# Altium footprint library con-samtec.PCBLIB: 805 footprints (part 29 of 55)
Each footprint in its own frame and in the unit in brackets; x right, y up, seen from the top. Pads: shape width x height; smd on the part's side, far side on the other; paste and mask are expansions set on the pad; w line width, h text height; cw(c..) or ccw(c..) is an arc to the next point about the centre after c.
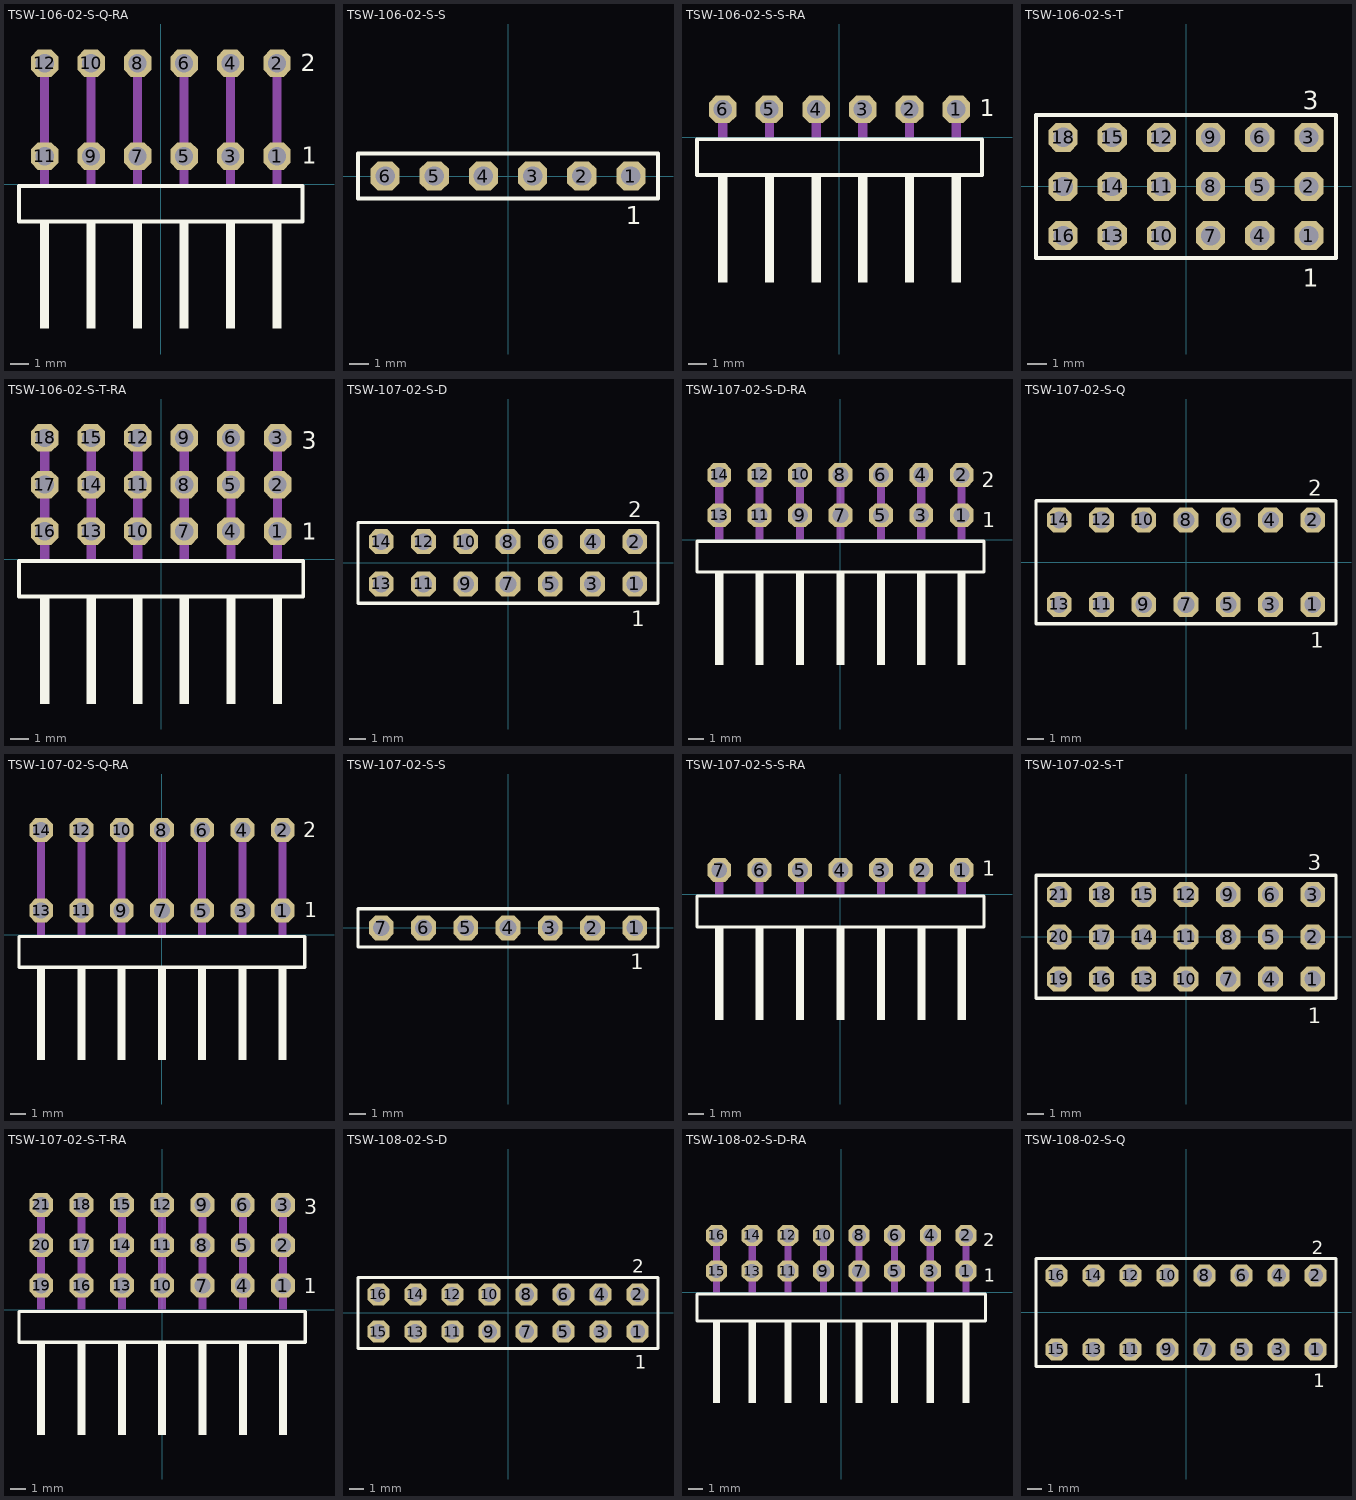
[diagram p28: the footprints below, top view; thin cyan lines are the x and y axes]

## TSW-106-02-S-Q-RA [mil]
pads (12):
  oct 59.06x59.06 hole 39.37: 1(250,60) 2(250,260) 3(150,60) 4(150,260) 5(50,60) 6(50,260) 7(-50,60) 8(-50,260) 9(-150,60) 10(-150,260) 11(-250,60) 12(-250,260)
Top Overlay:
  rectangle: -260,-310.63 -240,-80.32
  rectangle: -160,-310.63 -140,-80.32
  rectangle: -60,-310.63 -40,-80.32
  rectangle: 40,-310.63 60,-80.32
  rectangle: 140,-310.63 160,-80.32
  rectangle: 240,-310.63 260,-80.32
  lines w8: -305.08,-80.55 305.08,-80.55 305.08,-4.17 -305.08,-4.17 -305.08,-80.55
  text "1" at 303.54,43.31 h36.81
  text "2" at 301.18,242.72 h36.81
Mechanical 16:
  rectangle: -260,0 -240,270
  rectangle: -160,0 -140,270
  rectangle: -60,0 -40,270
  rectangle: 40,0 60,270
  rectangle: 140,0 160,270
  rectangle: 240,0 260,270

## TSW-106-02-S-S [mm]
pads (6):
  oct 1.5x1.5 hole 1: 1(6.35,0) 2(3.81,0) 3(1.27,0) 4(-1.27,0) 5(-3.81,0) 6(-6.35,0)
Top Overlay:
  lines w0.203: -7.749,-1.155 7.749,-1.155 7.749,1.155 -7.749,1.155 -7.749,-1.155
  text "1" at 6.092,-2.498 h0.94
Mechanical 16:
  rectangle: -6.7,-0.35 -6,0.35
  rectangle: -4.16,-0.35 -3.46,0.35
  rectangle: -1.62,-0.35 -0.92,0.35
  rectangle: 0.92,-0.35 1.62,0.35
  rectangle: 3.46,-0.35 4.16,0.35
  rectangle: 6,-0.35 6.7,0.35

## TSW-106-02-S-S-RA [mil]
pads (6):
  oct 59.06x59.06 hole 39.37: 1(250,60) 2(150,60) 3(50,60) 4(-50,60) 5(-150,60) 6(-250,60)
Top Overlay:
  rectangle: -260,-310.63 -240,-80.32
  rectangle: -160,-310.63 -140,-80.32
  rectangle: -60,-310.63 -40,-80.32
  rectangle: 40,-310.63 60,-80.32
  rectangle: 140,-310.63 160,-80.32
  rectangle: 240,-310.63 260,-80.32
  lines w8: -305.08,-80.55 305.08,-80.55 305.08,-4.17 -305.08,-4.17 -305.08,-80.55
  text "1" at 300.47,45.35 h36.81
Mechanical 16:
  rectangle: -260,0 -240,70
  rectangle: -160,0 -140,70
  rectangle: -60,0 -40,70
  rectangle: 40,0 60,70
  rectangle: 140,0 160,70
  rectangle: 240,0 260,70

## TSW-106-02-S-T [mm]
pads (18):
  oct 1.5x1.5 hole 1: 1(6.35,-2.54) 2(6.35,0) 3(6.35,2.54) 4(3.81,-2.54) 5(3.81,0) 6(3.81,2.54) 7(1.27,-2.54) 8(1.27,0) 9(1.27,2.54) 10(-1.27,-2.54) 11(-1.27,0) 12(-1.27,2.54) 13(-3.81,-2.54) 14(-3.81,0) 15(-3.81,2.54) 16(-6.35,-2.54) 17(-6.35,0) 18(-6.35,2.54)
Top Overlay:
  lines w0.203: -7.749,-3.695 7.749,-3.695 7.749,3.695 -7.749,3.695 -7.749,-3.695
  text "1" at 6.042,-5.188 h0.94
  text "3" at 6.038,3.989 h0.94
Mechanical 16:
  rectangle: -6.7,-2.89 -6,-2.19
  rectangle: -6.7,-0.35 -6,0.35
  rectangle: -6.7,2.19 -6,2.89
  rectangle: -4.16,-2.89 -3.46,-2.19
  rectangle: -4.16,-0.35 -3.46,0.35
  rectangle: -4.16,2.19 -3.46,2.89
  rectangle: -1.62,-2.89 -0.92,-2.19
  rectangle: -1.62,-0.35 -0.92,0.35
  rectangle: -1.62,2.19 -0.92,2.89
  rectangle: 0.92,-2.89 1.62,-2.19
  rectangle: 0.92,-0.35 1.62,0.35
  rectangle: 0.92,2.19 1.62,2.89
  rectangle: 3.46,-2.89 4.16,-2.19
  rectangle: 3.46,-0.35 4.16,0.35
  rectangle: 3.46,2.19 4.16,2.89
  rectangle: 6,-2.89 6.7,-2.19
  rectangle: 6,-0.35 6.7,0.35
  rectangle: 6,2.19 6.7,2.89

## TSW-106-02-S-T-RA [mil]
pads (18):
  oct 59.06x59.06 hole 39.37: 1(250,60) 2(250,160) 3(250,260) 4(150,60) 5(150,160) 6(150,260) 7(50,60) 8(50,160) 9(50,260) 10(-50,60) 11(-50,160) 12(-50,260) 13(-150,60) 14(-150,160) 15(-150,260) 16(-250,60) 17(-250,160) 18(-250,260)
Top Overlay:
  rectangle: -260,-310.63 -240,-80.32
  rectangle: -160,-310.63 -140,-80.32
  rectangle: -60,-310.63 -40,-80.32
  rectangle: 40,-310.63 60,-80.32
  rectangle: 140,-310.63 160,-80.32
  rectangle: 240,-310.63 260,-80.32
  lines w8: -305.08,-80.55 305.08,-80.55 305.08,-4.17 -305.08,-4.17 -305.08,-80.55
  text "1" at 301.57,41.34 h36.81
  text "3" at 302.17,236.81 h36.81
Mechanical 16:
  rectangle: -260,0 -240,270
  rectangle: -160,0 -140,270
  rectangle: -60,0 -40,270
  rectangle: 40,0 60,270
  rectangle: 140,0 160,270
  rectangle: 240,0 260,270

## TSW-107-02-S-D [mm]
pads (14):
  oct 1.5x1.5 hole 1: 1(7.62,-1.27) 2(7.62,1.27) 3(5.08,-1.27) 4(5.08,1.27) 5(2.54,-1.27) 6(2.54,1.27) 7(0,-1.27) 8(0,1.27) 9(-2.54,-1.27) 10(-2.54,1.27) 11(-5.08,-1.27) 12(-5.08,1.27) 13(-7.62,-1.27) 14(-7.62,1.27)
Top Overlay:
  lines w0.203: -9.019,-2.425 9.019,-2.425 9.019,2.425 -9.019,2.425 -9.019,-2.425
  text "1" at 7.412,-3.818 h0.94
  text "2" at 7.237,2.744 h0.94
Mechanical 16:
  rectangle: -7.97,-1.62 -7.27,-0.92
  rectangle: -7.97,0.92 -7.27,1.62
  rectangle: -5.43,-1.62 -4.73,-0.92
  rectangle: -5.43,0.92 -4.73,1.62
  rectangle: -2.89,-1.62 -2.19,-0.92
  rectangle: -2.89,0.92 -2.19,1.62
  rectangle: -0.35,-1.62 0.35,-0.92
  rectangle: -0.35,0.92 0.35,1.62
  rectangle: 2.19,-1.62 2.89,-0.92
  rectangle: 2.19,0.92 2.89,1.62
  rectangle: 4.73,-1.62 5.43,-0.92
  rectangle: 4.73,0.92 5.43,1.62
  rectangle: 7.27,-1.62 7.97,-0.92
  rectangle: 7.27,0.92 7.97,1.62

## TSW-107-02-S-D-RA [mil]
pads (14):
  oct 59.06x59.06 hole 39.37: 1(300,60) 2(300,160) 3(200,60) 4(200,160) 5(100,60) 6(100,160) 7(0,60) 8(0,160) 9(-100,60) 10(-100,160) 11(-200,60) 12(-200,160) 13(-300,60) 14(-300,160)
Top Overlay:
  rectangle: -310,-310.63 -290,-80.32
  rectangle: -210,-310.63 -190,-80.32
  rectangle: -110,-310.63 -90,-80.32
  rectangle: -10,-310.63 10,-80.32
  rectangle: 90,-310.63 110,-80.32
  rectangle: 190,-310.63 210,-80.32
  rectangle: 290,-310.63 310,-80.32
  lines w8: -355.08,-80.55 355.08,-80.55 355.08,-4.17 -355.08,-4.17 -355.08,-80.55
  text "1" at 350.59,30.51 h36.81
  text "2" at 349.21,129.53 h36.81
Mechanical 16:
  rectangle: -310,0 -290,170
  rectangle: -210,0 -190,170
  rectangle: -110,0 -90,170
  rectangle: -10,0 10,170
  rectangle: 90,0 110,170
  rectangle: 190,0 210,170
  rectangle: 290,0 310,170

## TSW-107-02-S-Q [mm]
pads (14):
  oct 1.5x1.5 hole 1: 1(7.62,-2.54) 2(7.62,2.54) 3(5.08,-2.54) 4(5.08,2.54) 5(2.54,-2.54) 6(2.54,2.54) 7(0,-2.54) 8(0,2.54) 9(-2.54,-2.54) 10(-2.54,2.54) 11(-5.08,-2.54) 12(-5.08,2.54) 13(-7.62,-2.54) 14(-7.62,2.54)
Top Overlay:
  lines w0.203: -9.019,-3.695 9.019,-3.695 9.019,3.695 -9.019,3.695 -9.019,-3.695
  text "1" at 7.462,-5.138 h0.94
  text "2" at 7.362,3.989 h0.94
Mechanical 16:
  rectangle: -7.97,-2.89 -7.27,-2.19
  rectangle: -7.97,2.19 -7.27,2.89
  rectangle: -5.43,-2.89 -4.73,-2.19
  rectangle: -5.43,2.19 -4.73,2.89
  rectangle: -2.89,-2.89 -2.19,-2.19
  rectangle: -2.89,2.19 -2.19,2.89
  rectangle: -0.35,-2.89 0.35,-2.19
  rectangle: -0.35,2.19 0.35,2.89
  rectangle: 2.19,-2.89 2.89,-2.19
  rectangle: 2.19,2.19 2.89,2.89
  rectangle: 4.73,-2.89 5.43,-2.19
  rectangle: 4.73,2.19 5.43,2.89
  rectangle: 7.27,-2.89 7.97,-2.19
  rectangle: 7.27,2.19 7.97,2.89

## TSW-107-02-S-Q-RA [mil]
pads (14):
  oct 59.06x59.06 hole 39.37: 1(300,60) 2(300,260) 3(200,60) 4(200,260) 5(100,60) 6(100,260) 7(0,60) 8(0,260) 9(-100,60) 10(-100,260) 11(-200,60) 12(-200,260) 13(-300,60) 14(-300,260)
Top Overlay:
  rectangle: -310,-310.63 -290,-80.32
  rectangle: -210,-310.63 -190,-80.32
  rectangle: -110,-310.63 -90,-80.32
  rectangle: -10,-310.63 10,-80.32
  rectangle: 90,-310.63 110,-80.32
  rectangle: 190,-310.63 210,-80.32
  rectangle: 290,-310.63 310,-80.32
  lines w8: -355.08,-80.55 355.08,-80.55 355.08,-4.17 -355.08,-4.17 -355.08,-80.55
  text "1" at 353.54,43.31 h36.81
  text "2" at 351.18,242.72 h36.81
Mechanical 16:
  rectangle: -310,0 -290,270
  rectangle: -210,0 -190,270
  rectangle: -110,0 -90,270
  rectangle: -10,0 10,270
  rectangle: 90,0 110,270
  rectangle: 190,0 210,270
  rectangle: 290,0 310,270

## TSW-107-02-S-S [mm]
pads (7):
  oct 1.5x1.5 hole 1: 1(7.62,0) 2(5.08,0) 3(2.54,0) 4(0,0) 5(-2.54,0) 6(-5.08,0) 7(-7.62,0)
Top Overlay:
  lines w0.203: -9.019,-1.155 9.019,-1.155 9.019,1.155 -9.019,1.155 -9.019,-1.155
  text "1" at 7.362,-2.498 h0.94
Mechanical 16:
  rectangle: -7.97,-0.35 -7.27,0.35
  rectangle: -5.43,-0.35 -4.73,0.35
  rectangle: -2.89,-0.35 -2.19,0.35
  rectangle: -0.35,-0.35 0.35,0.35
  rectangle: 2.19,-0.35 2.89,0.35
  rectangle: 4.73,-0.35 5.43,0.35
  rectangle: 7.27,-0.35 7.97,0.35

## TSW-107-02-S-S-RA [mil]
pads (7):
  oct 59.06x59.06 hole 39.37: 1(300,60) 2(200,60) 3(100,60) 4(0,60) 5(-100,60) 6(-200,60) 7(-300,60)
Top Overlay:
  rectangle: -310,-310.63 -290,-80.32
  rectangle: -210,-310.63 -190,-80.32
  rectangle: -110,-310.63 -90,-80.32
  rectangle: -10,-310.63 10,-80.32
  rectangle: 90,-310.63 110,-80.32
  rectangle: 190,-310.63 210,-80.32
  rectangle: 290,-310.63 310,-80.32
  lines w8: -355.08,-80.55 355.08,-80.55 355.08,-4.17 -355.08,-4.17 -355.08,-80.55
  text "1" at 350.47,45.35 h36.81
Mechanical 16:
  rectangle: -310,0 -290,70
  rectangle: -210,0 -190,70
  rectangle: -110,0 -90,70
  rectangle: -10,0 10,70
  rectangle: 90,0 110,70
  rectangle: 190,0 210,70
  rectangle: 290,0 310,70

## TSW-107-02-S-T [mm]
pads (21):
  oct 1.5x1.5 hole 1: 1(7.62,-2.54) 2(7.62,0) 3(7.62,2.54) 4(5.08,-2.54) 5(5.08,0) 6(5.08,2.54) 7(2.54,-2.54) 8(2.54,0) 9(2.54,2.54) 10(0,-2.54) 11(0,0) 12(0,2.54) 13(-2.54,-2.54) 14(-2.54,0) 15(-2.54,2.54) 16(-5.08,-2.54) 17(-5.08,0) 18(-5.08,2.54) 19(-7.62,-2.54) 20(-7.62,0) 21(-7.62,2.54)
Top Overlay:
  lines w0.203: -9.019,-3.695 9.019,-3.695 9.019,3.695 -9.019,3.695 -9.019,-3.695
  text "1" at 7.312,-5.188 h0.94
  text "3" at 7.308,3.989 h0.94
Mechanical 16:
  rectangle: -7.97,-2.89 -7.27,-2.19
  rectangle: -7.97,-0.35 -7.27,0.35
  rectangle: -7.97,2.19 -7.27,2.89
  rectangle: -5.43,-2.89 -4.73,-2.19
  rectangle: -5.43,-0.35 -4.73,0.35
  rectangle: -5.43,2.19 -4.73,2.89
  rectangle: -2.89,-2.89 -2.19,-2.19
  rectangle: -2.89,-0.35 -2.19,0.35
  rectangle: -2.89,2.19 -2.19,2.89
  rectangle: -0.35,-2.89 0.35,-2.19
  rectangle: -0.35,-0.35 0.35,0.35
  rectangle: -0.35,2.19 0.35,2.89
  rectangle: 2.19,-2.89 2.89,-2.19
  rectangle: 2.19,-0.35 2.89,0.35
  rectangle: 2.19,2.19 2.89,2.89
  rectangle: 4.73,-2.89 5.43,-2.19
  rectangle: 4.73,-0.35 5.43,0.35
  rectangle: 4.73,2.19 5.43,2.89
  rectangle: 7.27,-2.89 7.97,-2.19
  rectangle: 7.27,-0.35 7.97,0.35
  rectangle: 7.27,2.19 7.97,2.89

## TSW-107-02-S-T-RA [mil]
pads (21):
  oct 59.06x59.06 hole 39.37: 1(300,60) 2(300,160) 3(300,260) 4(200,60) 5(200,160) 6(200,260) 7(100,60) 8(100,160) 9(100,260) 10(0,60) 11(0,160) 12(0,260) 13(-100,60) 14(-100,160) 15(-100,260) 16(-200,60) 17(-200,160) 18(-200,260) 19(-300,60) 20(-300,160) 21(-300,260)
Top Overlay:
  rectangle: -310,-310.63 -290,-80.32
  rectangle: -210,-310.63 -190,-80.32
  rectangle: -110,-310.63 -90,-80.32
  rectangle: -10,-310.63 10,-80.32
  rectangle: 90,-310.63 110,-80.32
  rectangle: 190,-310.63 210,-80.32
  rectangle: 290,-310.63 310,-80.32
  lines w8: -355.08,-80.55 355.08,-80.55 355.08,-4.17 -355.08,-4.17 -355.08,-80.55
  text "1" at 351.57,41.34 h36.81
  text "3" at 352.17,236.81 h36.81
Mechanical 16:
  rectangle: -310,0 -290,270
  rectangle: -210,0 -190,270
  rectangle: -110,0 -90,270
  rectangle: -10,0 10,270
  rectangle: 90,0 110,270
  rectangle: 190,0 210,270
  rectangle: 290,0 310,270

## TSW-108-02-S-D [mm]
pads (16):
  oct 1.5x1.5 hole 1: 1(8.89,-1.27) 2(8.89,1.27) 3(6.35,-1.27) 4(6.35,1.27) 5(3.81,-1.27) 6(3.81,1.27) 7(1.27,-1.27) 8(1.27,1.27) 9(-1.27,-1.27) 10(-1.27,1.27) 11(-3.81,-1.27) 12(-3.81,1.27) 13(-6.35,-1.27) 14(-6.35,1.27) 15(-8.89,-1.27) 16(-8.89,1.27)
Top Overlay:
  lines w0.203: -10.289,-2.425 10.289,-2.425 10.289,2.425 -10.289,2.425 -10.289,-2.425
  text "1" at 8.682,-3.818 h0.94
  text "2" at 8.507,2.744 h0.94
Mechanical 16:
  rectangle: -9.24,-1.62 -8.54,-0.92
  rectangle: -9.24,0.92 -8.54,1.62
  rectangle: -6.7,-1.62 -6,-0.92
  rectangle: -6.7,0.92 -6,1.62
  rectangle: -4.16,-1.62 -3.46,-0.92
  rectangle: -4.16,0.92 -3.46,1.62
  rectangle: -1.62,-1.62 -0.92,-0.92
  rectangle: -1.62,0.92 -0.92,1.62
  rectangle: 0.92,-1.62 1.62,-0.92
  rectangle: 0.92,0.92 1.62,1.62
  rectangle: 3.46,-1.62 4.16,-0.92
  rectangle: 3.46,0.92 4.16,1.62
  rectangle: 6,-1.62 6.7,-0.92
  rectangle: 6,0.92 6.7,1.62
  rectangle: 8.54,-1.62 9.24,-0.92
  rectangle: 8.54,0.92 9.24,1.62

## TSW-108-02-S-D-RA [mil]
pads (16):
  oct 59.06x59.06 hole 39.37: 1(350,60) 2(350,160) 3(250,60) 4(250,160) 5(150,60) 6(150,160) 7(50,60) 8(50,160) 9(-50,60) 10(-50,160) 11(-150,60) 12(-150,160) 13(-250,60) 14(-250,160) 15(-350,60) 16(-350,160)
Top Overlay:
  rectangle: -360,-310.63 -340,-80.32
  rectangle: -260,-310.63 -240,-80.32
  rectangle: -160,-310.63 -140,-80.32
  rectangle: -60,-310.63 -40,-80.32
  rectangle: 40,-310.63 60,-80.32
  rectangle: 140,-310.63 160,-80.32
  rectangle: 240,-310.63 260,-80.32
  rectangle: 340,-310.63 360,-80.32
  lines w8: -405.08,-80.55 405.08,-80.55 405.08,-4.17 -405.08,-4.17 -405.08,-80.55
  text "1" at 400.59,30.51 h36.81
  text "2" at 399.21,129.53 h36.81
Mechanical 16:
  rectangle: -360,0 -340,170
  rectangle: -260,0 -240,170
  rectangle: -160,0 -140,170
  rectangle: -60,0 -40,170
  rectangle: 40,0 60,170
  rectangle: 140,0 160,170
  rectangle: 240,0 260,170
  rectangle: 340,0 360,170

## TSW-108-02-S-Q [mm]
pads (16):
  oct 1.5x1.5 hole 1: 1(8.89,-2.54) 2(8.89,2.54) 3(6.35,-2.54) 4(6.35,2.54) 5(3.81,-2.54) 6(3.81,2.54) 7(1.27,-2.54) 8(1.27,2.54) 9(-1.27,-2.54) 10(-1.27,2.54) 11(-3.81,-2.54) 12(-3.81,2.54) 13(-6.35,-2.54) 14(-6.35,2.54) 15(-8.89,-2.54) 16(-8.89,2.54)
Top Overlay:
  lines w0.203: -10.289,-3.695 10.289,-3.695 10.289,3.695 -10.289,3.695 -10.289,-3.695
  text "1" at 8.732,-5.138 h0.94
  text "2" at 8.632,3.989 h0.94
Mechanical 16:
  rectangle: -9.24,-2.89 -8.54,-2.19
  rectangle: -9.24,2.19 -8.54,2.89
  rectangle: -6.7,-2.89 -6,-2.19
  rectangle: -6.7,2.19 -6,2.89
  rectangle: -4.16,-2.89 -3.46,-2.19
  rectangle: -4.16,2.19 -3.46,2.89
  rectangle: -1.62,-2.89 -0.92,-2.19
  rectangle: -1.62,2.19 -0.92,2.89
  rectangle: 0.92,-2.89 1.62,-2.19
  rectangle: 0.92,2.19 1.62,2.89
  rectangle: 3.46,-2.89 4.16,-2.19
  rectangle: 3.46,2.19 4.16,2.89
  rectangle: 6,-2.89 6.7,-2.19
  rectangle: 6,2.19 6.7,2.89
  rectangle: 8.54,-2.89 9.24,-2.19
  rectangle: 8.54,2.19 9.24,2.89